# Altium footprint library SAMTEC SMD.PcbLib: 165 footprints (part 4 of 17)
Each footprint in its own frame and in the unit in brackets; x right, y up, seen from the top. Pads: shape width x height; smd on the part's side, far side on the other; paste and mask are expansions set on the pad; w line width, h text height; cw(c..) or ccw(c..) is an arc to the next point about the centre after c.
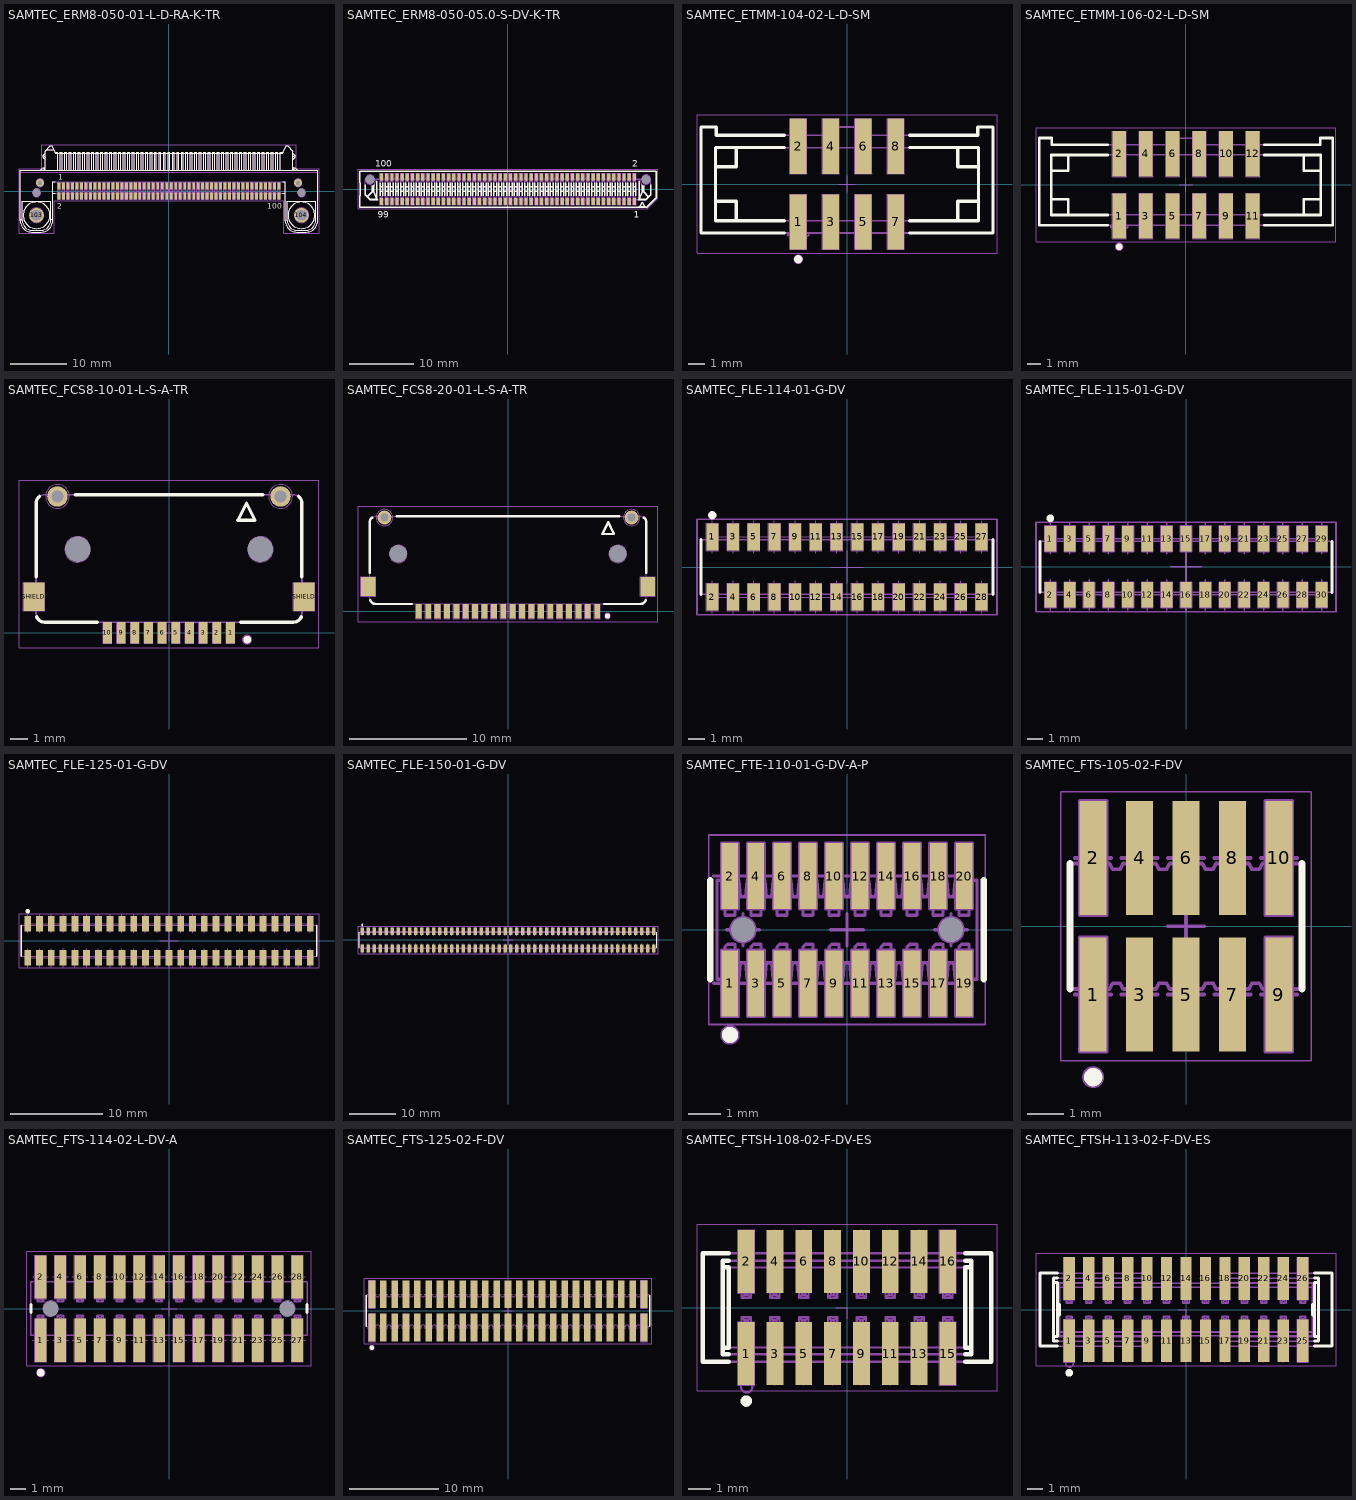
[diagram p3: the footprints below, top view; thin cyan lines are the x and y axes]

## SAMTEC_ERM8-050-01-L-D-RA-K-TR [mm] "100 Contacts, Pitch 0.8mm, Edge Rate™ Rugged High Speed Right Angle Header Strip"
height 6.25
pads (106):
  rect 0.5x1.25 smd: 1(-19.6,0.875) 2(-19.6,-0.875) 3(-18.8,0.875) 4(-18.8,-0.875) 5(-18,0.875) 6(-18,-0.875) 7(-17.2,0.875) 8(-17.2,-0.875) 9(-16.4,0.875) 10(-16.4,-0.875) 11(-15.6,0.875) 12(-15.6,-0.875) 13(-14.8,0.875) 14(-14.8,-0.875) 15(-14,0.875) 16(-14,-0.875) 17(-13.2,0.875) 18(-13.2,-0.875) 19(-12.4,0.875) 20(-12.4,-0.875) 21(-11.6,0.875) 22(-11.6,-0.875) 23(-10.8,0.875) 24(-10.8,-0.875) 25(-10,0.875) 26(-10,-0.875) 27(-9.2,0.875) 28(-9.2,-0.875) 29(-8.4,0.875) 30(-8.4,-0.875) 31(-7.6,0.875) 32(-7.6,-0.875) 33(-6.8,0.875) 34(-6.8,-0.875) 35(-6,0.875) 36(-6,-0.875) 37(-5.2,0.875) 38(-5.2,-0.875) 39(-4.4,0.875) 40(-4.4,-0.875) 41(-3.6,0.875) 42(-3.6,-0.875) 43(-2.8,0.875) 44(-2.8,-0.875) 45(-2,0.875) 46(-2,-0.875) 47(-1.2,0.875) 48(-1.2,-0.875) 49(-0.4,0.875) 50(-0.4,-0.875) 51(0.4,0.875) 52(0.4,-0.875) 53(1.2,0.875) 54(1.2,-0.875) 55(2,0.875) 56(2,-0.875) 57(2.8,0.875) 58(2.8,-0.875) 59(3.6,0.875) 60(3.6,-0.875) 61(4.4,0.875) 62(4.4,-0.875) 63(5.2,0.875) 64(5.2,-0.875) 65(6,0.875) 66(6,-0.875) 67(6.8,0.875) 68(6.8,-0.875) 69(7.6,0.875) 70(7.6,-0.875) 71(8.4,0.875) 72(8.4,-0.875) 73(9.2,0.875) 74(9.2,-0.875) 75(10,0.875) 76(10,-0.875) 77(10.8,0.875) 78(10.8,-0.875) 79(11.6,0.875) 80(11.6,-0.875) 81(12.4,0.875) 82(12.4,-0.875) 83(13.2,0.875) 84(13.2,-0.875) 85(14,0.875) 86(14,-0.875) 87(14.8,0.875) 88(14.8,-0.875) 89(15.6,0.875) 90(15.6,-0.875) 91(16.4,0.875) 92(16.4,-0.875) 93(17.2,0.875) 94(17.2,-0.875) 95(18,0.875) 96(18,-0.875) 97(18.8,0.875) 98(18.8,-0.875) 99(19.6,0.875) 100(19.6,-0.875)
  round 1.4 hole 0.7: 101(-23,1.47) 102(23,1.47)
  round 2.6 hole 1.9: 103(-23.625,-4.31) 104(23.625,-4.31)
  round 0.5 hole 1.45 unplated mask+0.475: 105(-23.625,-0.31) 106(23.625,-0.31)
Top Overlay:
  drawing of 313 lines, arcs and shapes, not listed
  text "2" at -19.95,-3.125 h1
  text "1" at -19.75,2.05 h1
  text "100" at 17.492,-3.15 h1
Mechanical 8:
  drawing of 640 lines, arcs and shapes, not listed
Mechanical 14:
  drawing of 511 lines, arcs and shapes, not listed
  text "2" at -19.95,-3.125 h1
  text "1" at -19.75,2.05 h1
  text "100" at 17.492,-3.15 h1
Mechanical 15:
  lines w0.05: -26.75,-7.56 -20.5,-7.56 -20.5,-1.75 20.5,-1.75 20.5,-7.56 26.75,-7.56 26.75,3.94 22.725,3.94 22.725,8.3 -22.722,8.3 -22.722,3.94 -26.75,3.94 -26.75,-7.56
3D body "SAMTEC_ERM8-050-01-L-D-RA-K-TR.stp": height 6.25, standoff -1.68, extent -26.5,-7.31 26.5,8.05

## SAMTEC_ERM8-050-05.0-S-DV-K-TR [mm] "100 Contacts, Pitch 0.8mm, Edge Rate™ Rugged High Speed Straight Header Strip"
height 8.91
pads (102):
  rect 0.5x1.1 smd: 1(19.6,-1.9) 2(19.6,1.9) 3(18.8,-1.9) 4(18.8,1.9) 5(18,-1.9) 6(18,1.9) 7(17.2,-1.9) 8(17.2,1.9) 9(16.4,-1.9) 10(16.4,1.9) 11(15.6,-1.9) 12(15.6,1.9) 13(14.8,-1.9) 14(14.8,1.9) 15(14,-1.9) 16(14,1.9) 17(13.2,-1.9) 18(13.2,1.9) 19(12.4,-1.9) 20(12.4,1.9) 21(11.6,-1.9) 22(11.6,1.9) 23(10.8,-1.9) 24(10.8,1.9) 25(10,-1.9) 26(10,1.9) 27(9.2,-1.9) 28(9.2,1.9) 29(8.4,-1.9) 30(8.4,1.9) 31(7.6,-1.9) 32(7.6,1.9) 33(6.8,-1.9) 34(6.8,1.9) 35(6,-1.9) 36(6,1.9) 37(5.2,-1.9) 38(5.2,1.9) 39(4.4,-1.9) 40(4.4,1.9) 41(3.6,-1.9) 42(3.6,1.9) 43(2.8,-1.9) 44(2.8,1.9) 45(2,-1.9) 46(2,1.9) 47(1.2,-1.9) 48(1.2,1.9) 49(0.4,-1.9) 50(0.4,1.9) 51(-0.4,-1.9) 52(-0.4,1.9) 53(-1.2,-1.9) 54(-1.2,1.9) 55(-2,-1.9) 56(-2,1.9) 57(-2.8,-1.9) 58(-2.8,1.9) 59(-3.6,-1.9) 60(-3.6,1.9) 61(-4.4,-1.9) 62(-4.4,1.9) 63(-5.2,-1.9) 64(-5.2,1.9) 65(-6,-1.9) 66(-6,1.9) 67(-6.8,-1.9) 68(-6.8,1.9) 69(-7.6,-1.9) 70(-7.6,1.9) 71(-8.4,-1.9) 72(-8.4,1.9) 73(-9.2,-1.9) 74(-9.2,1.9) 75(-10,-1.9) 76(-10,1.9) 77(-10.8,-1.9) 78(-10.8,1.9) 79(-11.6,-1.9) 80(-11.6,1.9) 81(-12.4,-1.9) 82(-12.4,1.9) 83(-13.2,-1.9) 84(-13.2,1.9) 85(-14,-1.9) 86(-14,1.9) 87(-14.8,-1.9) 88(-14.8,1.9) 89(-15.6,-1.9) 90(-15.6,1.9) 91(-16.4,-1.9) 92(-16.4,1.9) 93(-17.2,-1.9) 94(-17.2,1.9) 95(-18,-1.9) 96(-18,1.9) 97(-18.8,-1.9) 98(-18.8,1.9) 99(-19.6,-1.9) 100(-19.6,1.9)
  round 0.5 hole 1.45 unplated mask+0.475: 101(-21.4,1.5) 102(21.4,1.5)
Top Overlay:
  drawing of 240 lines, arcs and shapes, not listed
  text "99" at -20.194,-4.4 h1
  text "1" at 19.475,-4.4 h1
  text "100" at -20.558,3.45 h1
  text "2" at 19.225,3.45 h1
Mechanical 8:
  drawing of 626 lines, arcs and shapes, not listed
Mechanical 14:
  drawing of 1242 lines, arcs and shapes, not listed
  text "99" at -20.194,-4.4 h1
  text "1" at 19.475,-4.4 h1
  text "100" at -20.558,3.45 h1
  text "2" at 19.225,3.45 h1
Mechanical 15:
  lines w0.05: -23.25,-3.05 -23.25,3.05 23.25,3.05 23.25,-1.404 21.604,-3.05 -23.25,-3.05
3D body "SAMTEC_ERM8-050-05.0-S-DV-K-TR.stp": height 8.91, standoff -1.07, extent -23,-2.8 23,2.8

## SAMTEC_ETMM-104-02-L-D-SM [mm] "8 Contacts, Pitch 2mm, Dual Row Surface Mount Right Angle Shrouded Strain Relief IDC Header"
height 6.1
pads (8):
  rect 1.02x3.39 smd: 1(-3,-2.33) 2(-3,2.33) 3(-1,-2.33) 4(-1,2.33) 5(1,-2.33) 6(1,2.33) 7(3,-2.33) 8(3,2.33)
Top Overlay:
  circle w0.25: c-3,-4.625 r0.125
  lines w0.2: -8.095,-1.062 -6.825,-1.062 -6.825,-2.248 ; -8.095,1.062 -6.825,1.062 -6.825,2.248 ; -3.86,-3.01 -8.984,-3.01 -8.984,3.518 -8.044,3.518 -8.044,3.01 -3.86,3.01 ; -3.86,-2.248 -8.095,-2.248 -8.095,2.248 -3.86,2.248 ; 3.86,-3.01 8.984,-3.01 8.984,3.518 8.044,3.518 8.044,3.01 3.86,3.01 ; 3.86,-2.248 8.095,-2.248 8.095,2.248 3.86,2.248 ; 6.825,-2.248 6.825,-1.062 8.095,-1.062 ; 6.825,2.248 6.825,1.062 8.095,1.062
Mechanical 8:
  lines w0.05: -0.5,0 0,0 ; 0,-0.5 0,0 ; 0,0.5 0,0 ; 0.5,0 0,0 ; -3.51,-0.635 -2.49,-0.635 ; -3.51,-0.635 -3.51,-4.025 -2.49,-4.025 -2.49,-0.635 ; -3.51,-0.635 -3,-2.33 -2.49,-0.635 ; -3.51,0.635 -3.51,4.025 -2.49,4.025 -2.49,0.635 ; -3.51,0.635 -2.49,0.635 ; -3.51,0.635 -3,2.33 -2.49,0.635 ; -1.51,-0.635 -0.49,-0.635 ; -1.51,-0.635 -1.51,-4.025 -0.49,-4.025 -0.49,-0.635 ; -1.51,-0.635 -1,-2.33 -0.49,-0.635 ; -1.51,0.635 -1.51,4.025 -0.49,4.025 -0.49,0.635 ; -1.51,0.635 -0.49,0.635 ; -1.51,0.635 -1,2.33 -0.49,0.635 ; 0.49,-0.635 1.51,-0.635 ; 0.49,-0.635 0.49,-4.025 1.51,-4.025 1.51,-0.635 ; 0.49,-0.635 1,-2.33 1.51,-0.635 ; 0.49,0.635 0.49,4.025 1.51,4.025 1.51,0.635 ; 0.49,0.635 1.51,0.635 ; 0.49,0.635 1,2.33 1.51,0.635 ; 2.49,-0.635 3.51,-0.635 ; 2.49,-0.635 2.49,-4.025 3.51,-4.025 3.51,-0.635 ; 2.49,-0.635 3,-2.33 3.51,-0.635 ; 2.49,0.635 2.49,4.025 3.51,4.025 3.51,0.635 ; 2.49,0.635 3.51,0.635 ; 2.49,0.635 3,2.33 3.51,0.635
Mechanical 14:
  drawing of 166 lines, arcs and shapes, not listed
Mechanical 15:
  lines w0.05: -9.234,-4.265 9.234,-4.265 9.234,4.275 -9.234,4.275 -9.234,-4.265
3D body "SAMTEC_ETMM-104-02-L-D-SM.stp": height 6.1, standoff 0, extent -8.984,-3.746 8.984,3.747

## SAMTEC_ETMM-106-02-L-D-SM [mm] "12 Contacts, Pitch 2mm, Dual Row Surface Mount Right Angle Shrouded Strain Relief IDC Header"
height 6.1
pads (12):
  rect 1.02x3.39 smd: 1(-5,-2.33) 2(-5,2.33) 3(-3,-2.33) 4(-3,2.33) 5(-1,-2.33) 6(-1,2.33) 7(1,-2.33) 8(1,2.33) 9(3,-2.33) 10(3,2.33) 11(5,-2.33) 12(5,2.33)
Top Overlay:
  circle w0.25: c-5,-4.625 r0.125
  lines w0.2: -10.095,-1.062 -8.825,-1.062 -8.825,-2.248 ; -10.095,1.062 -8.825,1.062 -8.825,2.248 ; -5.86,-3.01 -10.984,-3.01 -10.984,3.518 -10.044,3.518 -10.044,3.01 -5.86,3.01 ; -5.86,-2.248 -10.095,-2.248 -10.095,2.248 -5.86,2.248 ; 5.86,-3.01 10.984,-3.01 10.984,3.518 10.044,3.518 10.044,3.01 5.86,3.01 ; 5.86,-2.248 10.095,-2.248 10.095,2.248 5.86,2.248 ; 8.825,-2.248 8.825,-1.062 10.095,-1.062 ; 8.825,2.248 8.825,1.062 10.095,1.062
Mechanical 8:
  lines w0.05: -0.5,0 0,0 ; 0,-0.5 0,0 ; 0,0.5 0,0 ; 0.5,0 0,0 ; -5.51,-0.635 -4.49,-0.635 ; -5.51,-0.635 -5.51,-4.025 -4.49,-4.025 -4.49,-0.635 ; -5.51,-0.635 -5,-2.33 -4.49,-0.635 ; -5.51,0.635 -5.51,4.025 -4.49,4.025 -4.49,0.635 ; -5.51,0.635 -4.49,0.635 ; -5.51,0.635 -5,2.33 -4.49,0.635 ; -3.51,-0.635 -2.49,-0.635 ; -3.51,-0.635 -3.51,-4.025 -2.49,-4.025 -2.49,-0.635 ; -3.51,-0.635 -3,-2.33 -2.49,-0.635 ; -3.51,0.635 -3.51,4.025 -2.49,4.025 -2.49,0.635 ; -3.51,0.635 -2.49,0.635 ; -3.51,0.635 -3,2.33 -2.49,0.635 ; -1.51,-0.635 -0.49,-0.635 ; -1.51,-0.635 -1.51,-4.025 -0.49,-4.025 -0.49,-0.635 ; -1.51,-0.635 -1,-2.33 -0.49,-0.635 ; -1.51,0.635 -1.51,4.025 -0.49,4.025 -0.49,0.635 ; -1.51,0.635 -0.49,0.635 ; -1.51,0.635 -1,2.33 -0.49,0.635 ; 0.49,-0.635 1.51,-0.635 ; 0.49,-0.635 0.49,-4.025 1.51,-4.025 1.51,-0.635 ; 0.49,-0.635 1,-2.33 1.51,-0.635 ; 0.49,0.635 0.49,4.025 1.51,4.025 1.51,0.635 ; 0.49,0.635 1.51,0.635 ; 0.49,0.635 1,2.33 1.51,0.635 ; 2.49,-0.635 3.51,-0.635 ; 2.49,-0.635 2.49,-4.025 3.51,-4.025 3.51,-0.635 ; 2.49,-0.635 3,-2.33 3.51,-0.635 ; 2.49,0.635 2.49,4.025 3.51,4.025 3.51,0.635 ; 2.49,0.635 3.51,0.635 ; 2.49,0.635 3,2.33 3.51,0.635 ; 4.49,-0.635 5.51,-0.635 ; 4.49,-0.635 4.49,-4.025 5.51,-4.025 5.51,-0.635 ; 4.49,-0.635 5,-2.33 5.51,-0.635 ; 4.49,0.635 4.49,4.025 5.51,4.025 5.51,0.635 ; 4.49,0.635 5.51,0.635 ; 4.49,0.635 5,2.33 5.51,0.635
Mechanical 14:
  drawing of 238 lines, arcs and shapes, not listed
Mechanical 15:
  lines w0.05: -11.233,-4.265 -11.233,4.275 11.233,4.275 11.233,-4.265 -11.233,-4.265
3D body "SAMTEC_ETMM-106-02-L-D-SM.stp": height 6.1, standoff 0, extent -10.983,-3.746 10.983,3.747

## SAMTEC_FCS8-10-01-L-S-A-TR [mm] "10 Contacts, Pitch 0.8mm, Right Angle, High Speed Cost Effective Coax Cable"
height 5.4
pads (16):
  rect 0.5x1.25 smd: 1(3.6,0) 2(2.8,0) 3(2,0) 4(1.2,0) 5(0.4,0) 6(-0.4,0) 7(-1.2,0) 8(-2,0) 9(-2.8,0) 10(-3.6,0)
  round 0.5 hole 1.5 unplated mask+0.5: POS1(5.35,4.885) POS2(-5.35,4.885)
  rect 1.25x1.65 smd: SHIELD(-7.905,2.11) SHIELD(7.905,2.11)
  round 1.2 hole 0.7: SHIELD(-6.53,7.981) SHIELD(6.53,7.981)
Top Overlay:
  circle w0.25: c4.575,-0.4 r0.1
  lines w0.2: -7.78,3.285 -7.78,7.58 cw(c-7.277,7.58) -7.58,7.982 ; -7.742,0.935 ccw(c-7.277,1.128) -7.277,0.625 -4.2,0.625 ; -5.485,8.085 5.485,8.085 ; 4.2,0.625 7.277,0.625 ccw(c7.277,1.128) 7.742,0.935 ; 7.58,7.982 cw(c7.277,7.58) 7.78,7.58 7.78,3.285 ; 4.035,6.585 4.535,7.585 5.035,6.585 4.035,6.585
Mechanical 8:
  circle w0.05: c-5.35,4.885 r0.75
  circle w0.05: c-6.53,7.981 r0.35
  circle w0.05: c-6.53,7.981 r0.7
  circle w0.05: c6.53,7.981 r0.35
  circle w0.05: c5.35,4.885 r0.75
  circle w0.05: c6.53,7.981 r0.7
  lines w0.05: -7.03,7.981 -6.53,7.981 ; -6.53,7.481 -6.53,7.981 ; -6.53,8.481 -6.53,7.981 ; -6.03,7.981 -6.53,7.981 ; -5.85,4.885 -5.35,4.885 ; -5.35,4.385 -5.35,4.885 ; -5.35,5.385 -5.35,4.885 ; -4.85,4.885 -5.35,4.885 ; -0.5,0 0,0 ; 0,-0.5 0,0 ; 0,0.5 0,0 ; 0.5,0 0,0 ; 4.85,4.885 5.35,4.885 ; 5.35,4.385 5.35,4.885 ; 5.35,5.385 5.35,4.885 ; 5.85,4.885 5.35,4.885 ; 6.03,7.981 6.53,7.981 ; 6.53,7.481 6.53,7.981 ; 6.53,8.481 6.53,7.981 ; 7.03,7.981 6.53,7.981 ; -8.53,2.935 -7.905,2.11 -7.28,2.935 ; -8.53,2.935 -8.53,1.285 -7.28,1.285 -7.28,2.935 ; -8.53,2.935 -7.28,2.935 ; -3.85,0.625 -3.6,0 -3.35,0.625 ; -3.85,0.625 -3.85,-0.625 -3.35,-0.625 -3.35,0.625 ; -3.85,0.625 -3.35,0.625 ; -3.05,0.625 -2.8,0 -2.55,0.625 ; -3.05,0.625 -3.05,-0.625 -2.55,-0.625 -2.55,0.625 ; -3.05,0.625 -2.55,0.625 ; -2.25,0.625 -2,0 -1.75,0.625 ; -2.25,0.625 -2.25,-0.625 -1.75,-0.625 -1.75,0.625 ; -2.25,0.625 -1.75,0.625 ; -1.45,0.625 -1.2,0 -0.95,0.625 ; -1.45,0.625 -1.45,-0.625 -0.95,-0.625 -0.95,0.625 ; -1.45,0.625 -0.95,0.625 ; -0.65,0.625 -0.4,0 -0.15,0.625 ; -0.65,0.625 -0.65,-0.625 -0.15,-0.625 -0.15,0.625 ; -0.65,0.625 -0.15,0.625 ; 0.15,0.625 0.4,0 0.65,0.625 ; 0.15,0.625 0.15,-0.625 0.65,-0.625 0.65,0.625 ; 0.15,0.625 0.65,0.625 ; 0.95,0.625 1.2,0 1.45,0.625 ; 0.95,0.625 0.95,-0.625 1.45,-0.625 1.45,0.625 ; 0.95,0.625 1.45,0.625 ; 1.75,0.625 2,0 2.25,0.625 ; 1.75,0.625 1.75,-0.625 2.25,-0.625 2.25,0.625 ; 1.75,0.625 2.25,0.625 ; 2.55,0.625 2.8,0 3.05,0.625 ; 2.55,0.625 2.55,-0.625 3.05,-0.625 3.05,0.625 ; 2.55,0.625 3.05,0.625 ; 3.35,0.625 3.6,0 3.85,0.625 ; 3.35,0.625 3.35,-0.625 3.85,-0.625 3.85,0.625 ; 3.35,0.625 3.85,0.625 ; 7.28,2.935 7.905,2.11 8.53,2.935 ; 7.28,2.935 7.28,1.285 8.53,1.285 8.53,2.935 ; 7.28,2.935 8.53,2.935
Mechanical 14:
  circle w0.1: c4.575,-0.4 r0.25
  lines w0.1: -7.78,1.128 ccw(c-7.277,1.128) -7.277,0.625 7.277,0.625 ccw(c7.277,1.128) 7.78,1.128 7.78,7.58 ccw(c7.277,7.58) 7.277,8.083 -7.277,8.083 ccw(c-7.277,7.58) -7.78,7.58 -7.78,1.128 ; 4.035,6.585 4.535,7.585 5.035,6.585 4.035,6.585
Mechanical 15:
  lines w0.05: -8.78,-0.875 -8.78,8.931 8.78,8.931 8.78,-0.875 -8.78,-0.875
3D body "SAMTEC_FCS8-10-01-L-S-A-TR.stp": height 5.4, standoff -1.4, extent -8.293,-0.393 8.293,8.085

## SAMTEC_FCS8-20-01-L-S-A-TR [mm] "20 Contacts, Pitch 0.8mm, Right Angle, High Speed Cost Effective Coax Cable"
height 5.4
pads (26):
  rect 0.5x1.25 smd: 1(7.6,0) 2(6.8,0) 3(6,0) 4(5.2,0) 5(4.4,0) 6(3.6,0) 7(2.8,0) 8(2,0) 9(1.2,0) 10(0.4,0) 11(-0.4,0) 12(-1.2,0) 13(-2,0) 14(-2.8,0) 15(-3.6,0) 16(-4.4,0) 17(-5.2,0) 18(-6,0) 19(-6.8,0) 20(-7.6,0)
  round 0.5 hole 1.5 unplated mask+0.5: POS1(9.35,4.885) POS2(-9.35,4.885)
  rect 1.25x1.65 smd: SHIELD(-11.905,2.11) SHIELD(11.905,2.11)
  round 1.2 hole 0.7: SHIELD(-10.53,7.981) SHIELD(10.53,7.981)
Top Overlay:
  circle w0.2: c8.475,-0.4 r0.125
  lines w0.2: -11.78,3.285 -11.78,7.58 cw(c-11.277,7.58) -11.58,7.982 ; -11.742,0.935 ccw(c-11.277,1.128) -11.277,0.625 -8.2,0.625 ; -9.485,8.085 9.485,8.085 ; 8.2,0.625 11.277,0.625 ccw(c11.277,1.128) 11.742,0.935 ; 11.58,7.982 cw(c11.277,7.58) 11.78,7.58 11.78,3.285 ; 8.035,6.585 9.035,6.585 8.535,7.585 8.035,6.585
Mechanical 8:
  drawing of 158 lines, arcs and shapes, not listed
Mechanical 14:
  circle w0.1: c8.475,-0.4 r0.25
  lines w0.1: -11.78,1.128 ccw(c-11.277,1.128) -11.277,0.625 11.277,0.625 ccw(c11.277,1.128) 11.78,1.128 11.78,7.58 ccw(c11.277,7.58) 11.277,8.083 -11.277,8.083 ccw(c-11.277,7.58) -11.78,7.58 -11.78,1.128 ; 8.035,6.585 9.035,6.585 8.535,7.585 8.035,6.585
Mechanical 15:
  lines w0.05: -12.78,-0.875 12.78,-0.875 12.78,8.931 -12.78,8.931 -12.78,-0.875
3D body "SAMTEC_FCS8-20-01-L-S-A-TR.stp": height 5.4, standoff -1.4, extent -12.293,-0.368 12.293,8.085

## SAMTEC_FLE-114-01-G-DV [mm] "28 Contacts - Pitch 1.27mm - Top Entry, Dual Row Surface Mount Receptacle"
height 4.55
pads (28):
  rect 0.74x1.675 smd: 1(-8.255,1.843) 2(-8.255,-1.843) 3(-6.985,1.843) 4(-6.985,-1.843) 5(-5.715,1.843) 6(-5.715,-1.843) 7(-4.445,1.843) 8(-4.445,-1.843) 9(-3.175,1.843) 10(-3.175,-1.843) 11(-1.905,1.843) 12(-1.905,-1.843) 13(-0.635,1.843) 14(-0.635,-1.843) 15(0.635,1.843) 16(0.635,-1.843) 17(1.905,1.843) 18(1.905,-1.843) 19(3.175,1.843) 20(3.175,-1.843) 21(4.445,1.843) 22(4.445,-1.843) 23(5.715,1.843) 24(5.715,-1.843) 25(6.985,1.843) 26(6.985,-1.843) 27(8.255,1.843) 28(8.255,-1.843)
Top Overlay:
  circle w0.25: c-8.257,3.175 r0.125
  lines w0.2: -8.945,-1.665 -8.945,1.665 ; 8.945,-1.665 8.945,1.665
Mechanical 8:
  drawing of 174 lines, arcs and shapes, not listed
Mechanical 14:
  circle w0.1: c-8.257,3.175 r0.125
  lines w0.1: -8.945,-1.665 -8.945,1.665 8.945,1.665 8.945,-1.665 -8.945,-1.665
Mechanical 15:
  lines w0.1: -9.195,-2.93 9.195,-2.93 9.195,2.93 -9.195,2.93 -9.195,-2.93
3D body "SAMTEC_FLE-114-01-G-DV.stp": height 4.55, standoff 0, extent -8.945,-2.299 8.945,2.299

## SAMTEC_FLE-115-01-G-DV [mm] "30 Contacts - Pitch 1.27mm - Top Entry, Dual Row Surface Mount Receptacle"
height 4.55
pads (30):
  rect 0.74x1.675 smd: 1(-8.89,1.843) 2(-8.89,-1.843) 3(-7.62,1.843) 4(-7.62,-1.843) 5(-6.35,1.843) 6(-6.35,-1.843) 7(-5.08,1.843) 8(-5.08,-1.843) 9(-3.81,1.843) 10(-3.81,-1.843) 11(-2.54,1.843) 12(-2.54,-1.843) 13(-1.27,1.843) 14(-1.27,-1.843) 15(0,1.843) 16(0,-1.843) 17(1.27,1.843) 18(1.27,-1.843) 19(2.54,1.843) 20(2.54,-1.843) 21(3.81,1.843) 22(3.81,-1.843) 23(5.08,1.843) 24(5.08,-1.843) 25(6.35,1.843) 26(6.35,-1.843) 27(7.62,1.843) 28(7.62,-1.843) 29(8.89,1.843) 30(8.89,-1.843)
Top Overlay:
  circle w0.25: c-8.892,3.175 r0.125
  lines w0.2: -9.58,-1.665 -9.58,1.665 ; 9.58,-1.665 9.58,1.665
Mechanical 8:
  drawing of 186 lines, arcs and shapes, not listed
Mechanical 14:
  circle w0.1: c-8.892,3.175 r0.125
  lines w0.1: -9.58,-1.665 9.58,-1.665 9.58,1.665 -9.58,1.665 -9.58,-1.665
Mechanical 15:
  lines w0.1: -9.83,-2.93 -9.83,2.93 9.83,2.93 9.83,-2.93 -9.83,-2.93
3D body "SAMTEC_FLE-115-01-G-DV.stp": height 4.55, standoff 0, extent -9.58,-2.299 9.58,2.299

## SAMTEC_FLE-125-01-G-DV [mm] "50 Contacts - Pitch 1.27mm - Top Entry, Dual Row Surface Mount Receptacle"
height 4.55
pads (50):
  rect 0.74x1.675 smd: 1(-15.24,1.843) 2(-15.24,-1.843) 3(-13.97,1.843) 4(-13.97,-1.843) 5(-12.7,1.843) 6(-12.7,-1.843) 7(-11.43,1.843) 8(-11.43,-1.843) 9(-10.16,1.843) 10(-10.16,-1.843) 11(-8.89,1.843) 12(-8.89,-1.843) 13(-7.62,1.843) 14(-7.62,-1.843) 15(-6.35,1.843) 16(-6.35,-1.843) 17(-5.08,1.843) 18(-5.08,-1.843) 19(-3.81,1.843) 20(-3.81,-1.843) 21(-2.54,1.843) 22(-2.54,-1.843) 23(-1.27,1.843) 24(-1.27,-1.843) 25(0,1.843) 26(0,-1.843) 27(1.27,1.843) 28(1.27,-1.843) 29(2.54,1.843) 30(2.54,-1.843) 31(3.81,1.843) 32(3.81,-1.843) 33(5.08,1.843) 34(5.08,-1.843) 35(6.35,1.843) 36(6.35,-1.843) 37(7.62,1.843) 38(7.62,-1.843) 39(8.89,1.843) 40(8.89,-1.843) 41(10.16,1.843) 42(10.16,-1.843) 43(11.43,1.843) 44(11.43,-1.843) 45(12.7,1.843) 46(12.7,-1.843) 47(13.97,1.843) 48(13.97,-1.843) 49(15.24,1.843) 50(15.24,-1.843)
Top Overlay:
  circle w0.25: c-15.242,3.175 r0.125
  lines w0.2: -15.932,-1.664 -15.932,1.664 ; 15.932,-1.664 15.932,1.664
Mechanical 8:
  lines w0.1: -15.61,-1.843 15.61,-1.843 ; -15.61,1.843 15.61,1.843 ; -15.24,-2.843 -15.24,-1.843 -15.24,-0.843 ; -15.24,0.843 -15.24,1.843 -15.24,2.843 ; -13.97,-2.843 -13.97,-1.843 -13.97,-0.843 ; -13.97,0.843 -13.97,1.843 -13.97,2.843 ; -12.7,-2.843 -12.7,-1.843 -12.7,-0.843 ; -12.7,0.843 -12.7,1.843 -12.7,2.843 ; -11.43,-2.843 -11.43,-1.843 -11.43,-0.843 ; -11.43,0.843 -11.43,1.843 -11.43,2.843 ; -10.16,-2.843 -10.16,-1.843 -10.16,-0.843 ; -10.16,0.843 -10.16,1.843 -10.16,2.843 ; -8.89,-2.843 -8.89,-1.843 -8.89,-0.843 ; -8.89,0.843 -8.89,1.843 -8.89,2.843 ; -7.62,-2.843 -7.62,-1.843 -7.62,-0.843 ; -7.62,0.843 -7.62,1.843 -7.62,2.843 ; -6.35,-2.843 -6.35,-1.843 -6.35,-0.843 ; -6.35,0.843 -6.35,1.843 -6.35,2.843 ; -5.08,-2.843 -5.08,-1.843 -5.08,-0.843 ; -5.08,0.843 -5.08,1.843 -5.08,2.843 ; -3.81,-2.843 -3.81,-1.843 -3.81,-0.843 ; -3.81,0.843 -3.81,1.843 -3.81,2.843 ; -2.54,-2.843 -2.54,-1.843 -2.54,-0.843 ; -2.54,0.843 -2.54,1.843 -2.54,2.843 ; -1.27,-2.843 -1.27,-1.843 -1.27,-0.843 ; -1.27,0.843 -1.27,1.843 -1.27,2.843 ; -1,0 0,0 ; 0,-2.843 0,-1.843 0,-0.843 ; 0,-1 0,0 ; 0,0.843 0,1.843 0,2.843 ; 0,1 0,0 ; 1,0 0,0 ; 1.27,-2.843 1.27,-1.843 1.27,-0.843 ; 1.27,0.843 1.27,1.843 1.27,2.843 ; 2.54,-2.843 2.54,-1.843 2.54,-0.843 ; 2.54,0.843 2.54,1.843 2.54,2.843 ; 3.81,-2.843 3.81,-1.843 3.81,-0.843 ; 3.81,0.843 3.81,1.843 3.81,2.843 ; 5.08,-2.843 5.08,-1.843 5.08,-0.843 ; 5.08,0.843 5.08,1.843 5.08,2.843 ; 6.35,-2.843 6.35,-1.843 6.35,-0.843 ; 6.35,0.843 6.35,1.843 6.35,2.843 ; 7.62,-2.843 7.62,-1.843 7.62,-0.843 ; 7.62,0.843 7.62,1.843 7.62,2.843 ; 8.89,-2.843 8.89,-1.843 8.89,-0.843 ; 8.89,0.843 8.89,1.843 8.89,2.843 ; 10.16,-2.843 10.16,-1.843 10.16,-0.843 ; 10.16,0.843 10.16,1.843 10.16,2.843 ; 11.43,-2.843 11.43,-1.843 11.43,-0.843 ; 11.43,0.843 11.43,1.843 11.43,2.843 ; 12.7,-2.843 12.7,-1.843 12.7,-0.843 ; 12.7,0.843 12.7,1.843 12.7,2.843 ; 13.97,-2.843 13.97,-1.843 13.97,-0.843 ; 13.97,0.843 13.97,1.843 13.97,2.843 ; 15.24,-2.843 15.24,-1.843 15.24,-0.843 ; 15.24,0.843 15.24,1.843 15.24,2.843
Mechanical 14:
  circle w0.1: c-15.242,3.175 r0.125
  lines w0.1: -15.932,-1.664 -15.932,1.664 15.932,1.664 15.932,-1.664 -15.932,-1.664
Mechanical 15:
  lines w0.1: -16.182,-2.93 16.182,-2.93 16.182,2.93 -16.182,2.93 -16.182,-2.93
3D body "SAMTEC_FLE-125-01-G-DV.stp": height 4.55, standoff 0, extent -15.932,-2.299 15.932,2.299

## SAMTEC_FLE-150-01-G-DV [mm] "100 Contacts - Pitch 1.27mm - Top Entry, Dual Row Surface Mount Receptacle"
height 4.55
pads (100):
  rect 0.74x1.675 smd: 1(-31.115,1.843) 2(-31.115,-1.843) 3(-29.845,1.843) 4(-29.845,-1.843) 5(-28.575,1.843) 6(-28.575,-1.843) 7(-27.305,1.843) 8(-27.305,-1.843) 9(-26.035,1.843) 10(-26.035,-1.843) 11(-24.765,1.843) 12(-24.765,-1.843) 13(-23.495,1.843) 14(-23.495,-1.843) 15(-22.225,1.843) 16(-22.225,-1.843) 17(-20.955,1.843) 18(-20.955,-1.843) 19(-19.685,1.843) 20(-19.685,-1.843) 21(-18.415,1.843) 22(-18.415,-1.843) 23(-17.145,1.843) 24(-17.145,-1.843) 25(-15.875,1.843) 26(-15.875,-1.843) 27(-14.605,1.843) 28(-14.605,-1.843) 29(-13.335,1.843) 30(-13.335,-1.843) 31(-12.065,1.843) 32(-12.065,-1.843) 33(-10.795,1.843) 34(-10.795,-1.843) 35(-9.525,1.843) 36(-9.525,-1.843) 37(-8.255,1.843) 38(-8.255,-1.843) 39(-6.985,1.843) 40(-6.985,-1.843) 41(-5.715,1.843) 42(-5.715,-1.843) 43(-4.445,1.843) 44(-4.445,-1.843) 45(-3.175,1.843) 46(-3.175,-1.843) 47(-1.905,1.843) 48(-1.905,-1.843) 49(-0.635,1.843) 50(-0.635,-1.843) 51(0.635,1.843) 52(0.635,-1.843) 53(1.905,1.843) 54(1.905,-1.843) 55(3.175,1.843) 56(3.175,-1.843) 57(4.445,1.843) 58(4.445,-1.843) 59(5.715,1.843) 60(5.715,-1.843) 61(6.985,1.843) 62(6.985,-1.843) 63(8.255,1.843) 64(8.255,-1.843) 65(9.525,1.843) 66(9.525,-1.843) 67(10.795,1.843) 68(10.795,-1.843) 69(12.065,1.843) 70(12.065,-1.843) 71(13.335,1.843) 72(13.335,-1.843) 73(14.605,1.843) 74(14.605,-1.843) 75(15.875,1.843) 76(15.875,-1.843) 77(17.145,1.843) 78(17.145,-1.843) 79(18.415,1.843) 80(18.415,-1.843) 81(19.685,1.843) 82(19.685,-1.843) 83(20.955,1.843) 84(20.955,-1.843) 85(22.225,1.843) 86(22.225,-1.843) 87(23.495,1.843) 88(23.495,-1.843) 89(24.765,1.843) 90(24.765,-1.843) 91(26.035,1.843) 92(26.035,-1.843) 93(27.305,1.843) 94(27.305,-1.843) 95(28.575,1.843) 96(28.575,-1.843) 97(29.845,1.843) 98(29.845,-1.843) 99(31.115,1.843) 100(31.115,-1.843)
Top Overlay:
  circle w0.25: c-31.117,3.175 r0.125
  lines w0.2: -31.807,-1.664 -31.807,1.664 ; 31.807,-1.664 31.807,1.664
Mechanical 8:
  drawing of 206 lines, arcs and shapes, not listed
Mechanical 14:
  circle w0.1: c-31.117,3.175 r0.125
  lines w0.1: -31.807,-1.664 -31.807,1.664 31.807,1.664 31.807,-1.664 -31.807,-1.664
Mechanical 15:
  lines w0.1: -32.057,-2.93 32.057,-2.93 32.057,2.93 -32.057,2.93 -32.057,-2.93
3D body "SAMTEC_FLE-150-01-G-DV.stp": height 4.55, standoff 0, extent -31.807,-2.299 31.807,2.299

## SAMTEC_FTE-110-01-G-DV-A-P [mm] "20 Contacts - Pitch 0.8mm - Dual Row, Vertical, Surface Mount Terminal Strip Header With Alignment Pin and Plastic Pick & Place Pad"
height 3.6
pads (22):
  rect 0.508x2.03 smd: 1(-3.6,-1.65) 2(-3.6,1.65) 3(-2.8,-1.65) 4(-2.8,1.65) 5(-2,-1.65) 6(-2,1.65) 7(-1.2,-1.65) 8(-1.2,1.65) 9(-0.4,-1.65) 10(-0.4,1.65) 11(0.4,-1.65) 12(0.4,1.65) 13(1.2,-1.65) 14(1.2,1.65) 15(2,-1.65) 16(2,1.65) 17(2.8,-1.65) 18(2.8,1.65) 19(3.6,-1.65) 20(3.6,1.65)
  round 0.5 hole 0.75 unplated mask+0.125: POS1(-3.2,0) POS2(3.2,0)
Top Overlay:
  circle w0.25: c-3.598,-3.235 r0.125
  lines w0.2: -4.204,-1.524 -4.204,1.524 ; 4.204,-1.524 4.204,1.524
Mechanical 8:
  drawing of 154 lines, arcs and shapes, not listed
Mechanical 14:
  drawing of 177 lines, arcs and shapes, not listed
Mechanical 15:
  lines w0.05: -4.251,-2.915 4.251,-2.915 4.251,2.915 -4.251,2.915 -4.251,-2.915
3D body "SAMTEC_FTE-110-01-G-DV-A-P.stp": height 3.61, standoff -0.71, extent -4,-2.286 4.001,2.286

## SAMTEC_FTS-105-02-F-DV [mm] "10 Contacts - Pitch 1.27mm - Dual Row, Vertical, Surface Mount Terminal Strip"
height 3.18
pads (10):
  rect 0.74x3.125 smd: 1(-2.54,-1.868) 2(-2.54,1.868) 3(-1.27,-1.868) 4(-1.27,1.868) 5(0,-1.868) 6(0,1.868) 7(1.27,-1.868) 8(1.27,1.868) 9(2.54,-1.868) 10(2.54,1.868)
Top Overlay:
  circle w0.25: c-2.538,-4.128 r0.125
  circle w0.25: c-2.538,-4.128 r0.125
  lines w0.2: -3.175,-1.714 -3.175,1.714 ; 3.175,-1.714 3.175,1.714
Mechanical 8:
  lines w0.1: -3.04,-1.868 -2.54,-1.868 ; -3.04,1.868 -2.54,1.868 ; -2.54,-2.368 -2.54,-1.868 ; -2.54,-1.368 -2.54,-1.868 ; -2.54,1.368 -2.54,1.868 ; -2.54,2.368 -2.54,1.868 ; -2.04,-1.868 -2.54,-1.868 ; -2.04,1.868 -2.54,1.868 ; -1.77,-1.868 -1.27,-1.868 ; -1.77,1.868 -1.27,1.868 ; -1.27,-2.368 -1.27,-1.868 ; -1.27,-1.368 -1.27,-1.868 ; -1.27,1.368 -1.27,1.868 ; -1.27,2.368 -1.27,1.868 ; -0.77,-1.868 -1.27,-1.868 ; -0.77,1.868 -1.27,1.868 ; -0.5,-1.868 0,-1.868 ; -0.5,0 0,0 ; -0.5,1.868 0,1.868 ; 0,-2.368 0,-1.868 ; 0,-1.368 0,-1.868 ; 0,-0.5 0,0 ; 0,0.5 0,0 ; 0,1.368 0,1.868 ; 0,2.368 0,1.868 ; 0.5,-1.868 0,-1.868 ; 0.5,0 0,0 ; 0.5,1.868 0,1.868 ; 0.77,-1.868 1.27,-1.868 ; 0.77,1.868 1.27,1.868 ; 1.27,-2.368 1.27,-1.868 ; 1.27,-1.368 1.27,-1.868 ; 1.27,1.368 1.27,1.868 ; 1.27,2.368 1.27,1.868 ; 1.77,-1.868 1.27,-1.868 ; 1.77,1.868 1.27,1.868 ; 2.04,-1.868 2.54,-1.868 ; 2.04,1.868 2.54,1.868 ; 2.54,-2.368 2.54,-1.868 ; 2.54,-1.368 2.54,-1.868 ; 2.54,1.368 2.54,1.868 ; 2.54,2.368 2.54,1.868 ; 3.04,-1.868 2.54,-1.868 ; 3.04,1.868 2.54,1.868 ; -2.91,-3.43 -2.91,-0.305 -2.17,-0.305 -2.17,-3.43 -2.91,-3.43 ; -2.91,0.305 -2.17,0.305 -2.17,3.43 -2.91,3.43 -2.91,0.305 ; 2.17,-3.43 2.91,-3.43 2.91,-0.305 2.17,-0.305 2.17,-3.43 ; 2.17,0.305 2.91,0.305 2.91,3.43 2.17,3.43 2.17,0.305
Mechanical 14:
  drawing of 187 lines, arcs and shapes, not listed
Mechanical 15:
  lines w0.05: -3.425,-3.68 -3.425,3.68 3.425,3.68 3.425,-3.68 -3.425,-3.68
3D body "SAMTEC_FTS-105-02-F-DV.stp": height 3.17, standoff 0, extent -3.175,-2.921 3.175,2.921

## SAMTEC_FTS-114-02-L-DV-A [mm] "28 Contacts, Pitch 1.27mm - Dual Row Surface Mount Straight Strip Header"
height 3.18
pads (30):
  rect 0.74x2.79 smd: 1(-8.255,-2.035) 2(-8.255,2.035) 3(-6.985,-2.035) 4(-6.985,2.035) 5(-5.715,-2.035) 6(-5.715,2.035) 7(-4.445,-2.035) 8(-4.445,2.035) 9(-3.175,-2.035) 10(-3.175,2.035) 11(-1.905,-2.035) 12(-1.905,2.035) 13(-0.635,-2.035) 14(-0.635,2.035) 15(0.635,-2.035) 16(0.635,2.035) 17(1.905,-2.035) 18(1.905,2.035) 19(3.175,-2.035) 20(3.175,2.035) 21(4.445,-2.035) 22(4.445,2.035) 23(5.715,-2.035) 24(5.715,2.035) 25(6.985,-2.035) 26(6.985,2.035) 27(8.255,-2.035) 28(8.255,2.035)
  round 0.5 hole 1 unplated mask+0.25: 29(-7.62,0) 30(7.62,0)
Top Overlay:
  circle w0.25: c-8.253,-4.128 r0.125
  circle w0.25: c-8.253,-4.128 r0.125
  lines w0.2: -8.89,-0.254 -8.89,0.254 ; 8.89,-0.254 8.89,0.254
Mechanical 8:
  drawing of 239 lines, arcs and shapes, not listed
Mechanical 14:
  drawing of 425 lines, arcs and shapes, not listed
Mechanical 15:
  lines w0.05: -9.14,-3.68 -9.14,3.68 9.14,3.68 9.14,-3.68 -9.14,-3.68
3D body "SAMTEC_FTS-114-02-L-DV-A.stp": height 3.17, standoff -0.86, extent -8.89,-2.921 8.89,2.921

## SAMTEC_FTS-125-02-F-DV [mm] "50 Contacts - Pitch 1.27mm - Dual Row, Vertical, Surface Mount Terminal Strip"
height 3.18
pads (50):
  rect 0.74x3.125 smd: 1(-15.24,-1.868) 2(-15.24,1.868) 3(-13.97,-1.868) 4(-13.97,1.868) 5(-12.7,-1.868) 6(-12.7,1.868) 7(-11.43,-1.868) 8(-11.43,1.868) 9(-10.16,-1.868) 10(-10.16,1.868) 11(-8.89,-1.868) 12(-8.89,1.868) 13(-7.62,-1.868) 14(-7.62,1.868) 15(-6.35,-1.868) 16(-6.35,1.868) 17(-5.08,-1.868) 18(-5.08,1.868) 19(-3.81,-1.868) 20(-3.81,1.868) 21(-2.54,-1.868) 22(-2.54,1.868) 23(-1.27,-1.868) 24(-1.27,1.868) 25(0,-1.868) 26(0,1.868) 27(1.27,-1.868) 28(1.27,1.868) 29(2.54,-1.868) 30(2.54,1.868) 31(3.81,-1.868) 32(3.81,1.868) 33(5.08,-1.868) 34(5.08,1.868) 35(6.35,-1.868) 36(6.35,1.868) 37(7.62,-1.868) 38(7.62,1.868) 39(8.89,-1.868) 40(8.89,1.868) 41(10.16,-1.868) 42(10.16,1.868) 43(11.43,-1.868) 44(11.43,1.868) 45(12.7,-1.868) 46(12.7,1.868) 47(13.97,-1.868) 48(13.97,1.868) 49(15.24,-1.868) 50(15.24,1.868)
Top Overlay:
  circle w0.25: c-15.238,-4.128 r0.125
  circle w0.25: c-15.238,-4.128 r0.125
  lines w0.2: -15.875,-1.714 -15.875,1.714 ; 15.875,-1.714 15.875,1.714
Mechanical 8:
  drawing of 220 lines, arcs and shapes, not listed
Mechanical 14:
  drawing of 947 lines, arcs and shapes, not listed
Mechanical 15:
  lines w0.05: -16.125,-3.68 -16.125,3.68 16.125,3.68 16.125,-3.68 -16.125,-3.68
3D body "SAMTEC_FTS-125-01-F-DV.stp": height 4.32, standoff 0, extent -15.875,-2.921 15.875,2.921

## SAMTEC_FTSH-108-02-F-DV-ES [mm] "16 Contacts, Pitch 1.27mm, Dual Row SMT Micro Straight Header With End Shroud"
height 4.83
pads (16):
  rect 0.74x2.79 smd: 1(-4.445,-2.032) 2(-4.445,2.032) 3(-3.175,-2.032) 4(-3.175,2.032) 5(-1.905,-2.032) 6(-1.905,2.032) 7(-0.635,-2.032) 8(-0.635,2.032) 9(0.635,-2.032) 10(0.635,2.032) 11(1.905,-2.032) 12(1.905,2.032) 13(3.175,-2.032) 14(3.175,2.032) 15(4.445,-2.032) 16(4.445,2.032)
Top Overlay:
  circle w0.25: c-4.441,-4.127 r0.125
  lines w0.2: -5.474,-1.765 -5.22,-1.765 -5.22,1.765 -5.474,1.765 ; -5.22,-2.388 -6.363,-2.388 -6.363,2.388 -5.22,2.388 ; -5.22,-2.059 -5.474,-2.059 -5.474,2.059 -5.22,2.059 ; 5.22,-2.388 6.363,-2.388 6.363,2.388 5.22,2.388 ; 5.22,-2.059 5.474,-2.059 5.474,2.059 5.22,2.059 ; 5.474,-1.765 5.22,-1.765 5.22,1.765 5.474,1.765
Mechanical 8:
  lines w0.05: -4.813,-2.032 -4.445,-2.032 -4.445,-3.429 ; -4.813,2.032 -4.445,2.032 -4.445,3.429 ; -3.543,-2.032 -3.175,-2.032 -3.175,-3.429 ; -3.543,2.032 -3.175,2.032 -3.175,3.429 ; -2.273,-2.032 -1.905,-2.032 -1.905,-3.429 ; -2.273,2.032 -1.905,2.032 -1.905,3.429 ; -1.003,-2.032 -0.635,-2.032 -0.635,-3.429 ; -1.003,2.032 -0.635,2.032 -0.635,3.429 ; -0.5,0 0,0 0,-0.5 ; 0.267,-2.032 0.635,-2.032 0.635,-3.429 ; 0.267,2.032 0.635,2.032 0.635,3.429 ; 1.537,-2.032 1.905,-2.032 1.905,-3.429 ; 1.537,2.032 1.905,2.032 1.905,3.429 ; 2.807,-2.032 3.175,-2.032 3.175,-3.429 ; 2.807,2.032 3.175,2.032 3.175,3.429 ; 4.077,-2.032 4.445,-2.032 4.445,-3.429 ; 4.077,2.032 4.445,2.032 4.445,3.429 ; -4.813,-3.429 -4.813,-0.635 -4.077,-0.635 -4.077,-3.429 -4.813,-3.429 ; -4.813,0.635 -4.813,3.429 -4.077,3.429 -4.077,0.635 -4.813,0.635 ; 4.077,-3.429 4.077,-0.635 4.813,-0.635 4.813,-3.429 4.077,-3.429 ; 4.077,0.635 4.077,3.429 4.813,3.429 4.813,0.635 4.077,0.635
Mechanical 14:
  drawing of 265 lines, arcs and shapes, not listed
Mechanical 15:
  lines w0.05: -6.613,-3.679 -6.613,3.679 6.613,3.679 6.613,-3.679 -6.613,-3.679
3D body "SAMTEC_FTSH-108-02-F-DV-ES.stp": height 4.93, standoff 0, extent -6.363,-2.921 6.363,2.921

## SAMTEC_FTSH-113-02-F-DV-ES [mm] "26 Contacts, Pitch 1.27mm, Dual Row SMT Micro Straight Header With End Shroud"
height 4.83
pads (26):
  rect 0.74x2.79 smd: 1(-7.62,-2.032) 2(-7.62,2.032) 3(-6.35,-2.032) 4(-6.35,2.032) 5(-5.08,-2.032) 6(-5.08,2.032) 7(-3.81,-2.032) 8(-3.81,2.032) 9(-2.54,-2.032) 10(-2.54,2.032) 11(-1.27,-2.032) 12(-1.27,2.032) 13(0,-2.032) 14(0,2.032) 15(1.27,-2.032) 16(1.27,2.032) 17(2.54,-2.032) 18(2.54,2.032) 19(3.81,-2.032) 20(3.81,2.032) 21(5.08,-2.032) 22(5.08,2.032) 23(6.35,-2.032) 24(6.35,2.032) 25(7.62,-2.032) 26(7.62,2.032)
Top Overlay:
  circle w0.25: c-7.616,-4.127 r0.125
  lines w0.2: -8.649,-1.765 -8.4,-1.765 ; -8.649,1.765 -8.395,1.765 -8.395,-1.765 ; -8.395,-2.388 -9.538,-2.388 -9.538,2.388 -8.395,2.388 ; -8.395,-2.059 -8.649,-2.059 -8.649,2.059 -8.395,2.059 ; -8.255,-0.335 -8.255,0.335 ; 8.255,-0.335 8.255,0.335 ; 8.395,-2.388 9.538,-2.388 9.538,2.388 8.395,2.388 ; 8.395,-2.059 8.649,-2.059 8.649,2.059 8.395,2.059 ; 8.649,-1.765 8.395,-1.765 8.395,1.765 8.649,1.765
Mechanical 8:
  lines w0.05: -7.988,-2.032 -7.62,-2.032 -7.62,-3.429 ; -7.988,2.032 -7.62,2.032 -7.62,3.429 ; -6.718,-2.032 -6.35,-2.032 -6.35,-3.429 ; -6.718,2.032 -6.35,2.032 -6.35,3.429 ; -5.448,-2.032 -5.08,-2.032 -5.08,-3.429 ; -5.448,2.032 -5.08,2.032 -5.08,3.429 ; -4.178,-2.032 -3.81,-2.032 -3.81,-3.429 ; -4.178,2.032 -3.81,2.032 -3.81,3.429 ; -2.908,-2.032 -2.54,-2.032 -2.54,-3.429 ; -2.908,2.032 -2.54,2.032 -2.54,3.429 ; -1.638,-2.032 -1.27,-2.032 -1.27,-3.429 ; -1.638,2.032 -1.27,2.032 -1.27,3.429 ; -0.5,0 0,0 0,-0.5 ; -0.368,-2.032 0,-2.032 0,-3.429 ; -0.368,2.032 0,2.032 0,3.429 ; 0.902,-2.032 1.27,-2.032 1.27,-3.429 ; 0.902,2.032 1.27,2.032 1.27,3.429 ; 2.172,-2.032 2.54,-2.032 2.54,-3.429 ; 2.172,2.032 2.54,2.032 2.54,3.429 ; 3.442,-2.032 3.81,-2.032 3.81,-3.429 ; 3.442,2.032 3.81,2.032 3.81,3.429 ; 4.712,-2.032 5.08,-2.032 5.08,-3.429 ; 4.712,2.032 5.08,2.032 5.08,3.429 ; 5.982,-2.032 6.35,-2.032 6.35,-3.429 ; 5.982,2.032 6.35,2.032 6.35,3.429 ; 7.252,-2.032 7.62,-2.032 7.62,-3.429 ; 7.252,2.032 7.62,2.032 7.62,3.429 ; -7.988,-3.429 -7.252,-3.429 -7.252,-0.635 -7.988,-0.635 -7.988,-3.429 ; -7.988,0.635 -7.252,0.635 -7.252,3.429 -7.988,3.429 -7.988,0.635 ; 7.252,-3.429 7.988,-3.429 7.988,-0.635 7.252,-0.635 7.252,-3.429 ; 7.252,0.635 7.988,0.635 7.988,3.429 7.252,3.429 7.252,0.635
Mechanical 14:
  drawing of 419 lines, arcs and shapes, not listed
Mechanical 15:
  lines w0.05: -9.788,-3.679 9.788,-3.679 9.788,3.679 -9.788,3.679 -9.788,-3.679
3D body "SAMTEC_FTSH-113-02-F-DV-ES.stp": height 4.93, standoff 0, extent -9.538,-2.921 9.538,2.921